# Altium footprint library connectors_socets.pcblib: 567 footprints (part 25 of 36)
Each footprint in its own frame and in the unit in brackets; x right, y up, seen from the top. Pads: shape width x height; smd on the part's side, far side on the other; paste and mask are expansions set on the pad; w line width, h text height; cw(c..) or ccw(c..) is an arc to the next point about the centre after c.
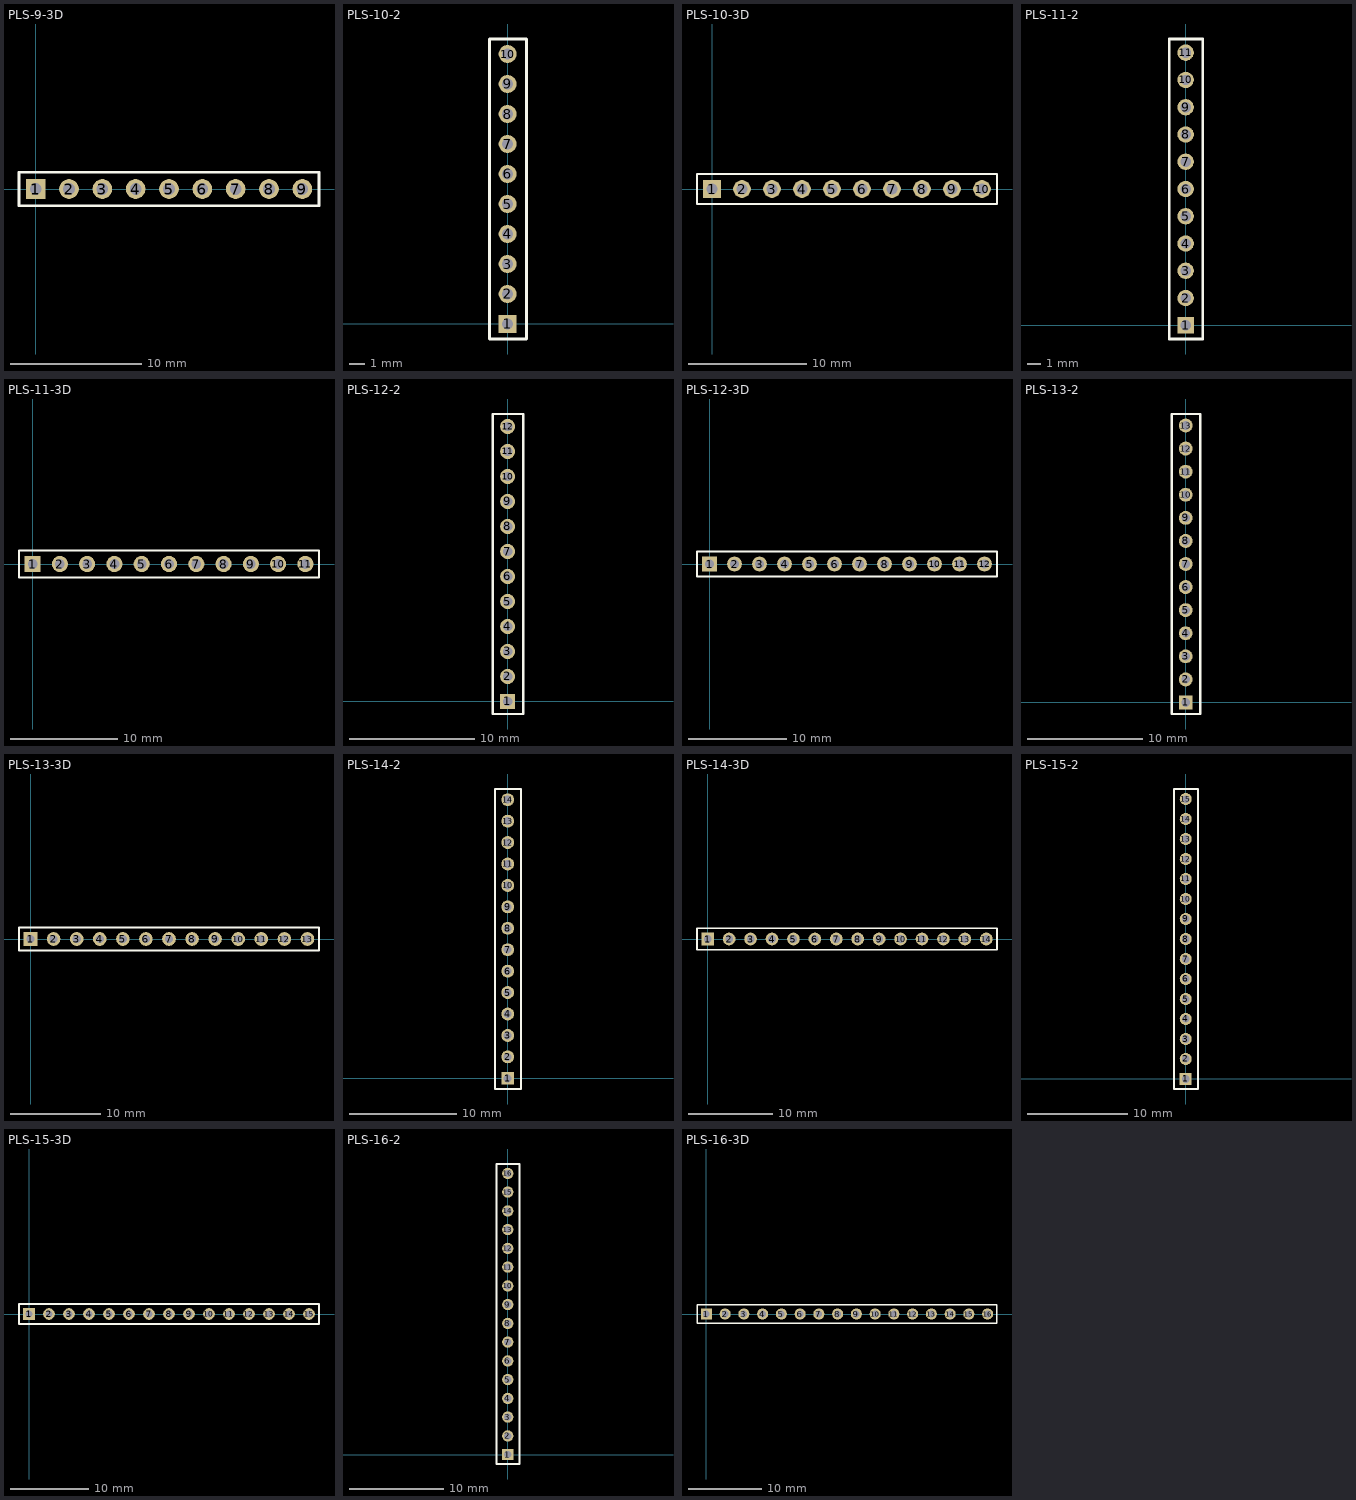
[diagram p24: the footprints below, top view; thin cyan lines are the x and y axes]

## PLS-9-3D [mm] "Connector; Header; 9 Position"
height 7.5
pads (9):
  rect 1.5x1.5 hole 0.9: 1(0,0)
  round 1.5 hole 0.9: 2(2.54,0) 3(5.08,0) 4(7.62,0) 5(10.16,0) 6(12.7,0) 7(15.24,0) 8(17.78,0) 9(20.32,0)
Top Overlay:
  lines w0.2: -1.27,-1.27 -1.27,1.27 21.59,1.27 21.59,-1.27 -1.27,-1.27
3D body "PLS-1.step": height 8.44, standoff -3, extent 19.05,-1.27 21.59,1.27
3D body "PLS-1.step": height 8.44, standoff -3, extent 16.51,-1.27 19.05,1.27
3D body "PLS-1.step": height 8.44, standoff -3, extent 13.97,-1.27 16.51,1.27
3D body "PLS-1.step": height 8.44, standoff -3, extent 11.43,-1.27 13.97,1.27
3D body "PLS-1.step": height 8.44, standoff -3, extent 8.89,-1.27 11.43,1.27
3D body "PLS-1.step": height 8.44, standoff -3, extent 6.35,-1.27 8.89,1.27
3D body "PLS-1.step": height 8.44, standoff -3, extent 3.81,-1.27 6.35,1.27
3D body "PLS-1.step": height 8.44, standoff -3, extent 1.27,-1.27 3.81,1.27
3D body "PLS-1.step": height 8.44, standoff -3, extent -1.27,-1.27 1.27,1.27

## PLS-10-2 [mm] "Connector; Header; 1x10 Position"
height 6
pads (10):
  rect 1.2x1.2 hole 0.75: 1(0,0)
  round 1.2 hole 0.75: 2(0,2) 3(0,4) 4(0,6) 5(0,8)
  round 1.2 hole 0.75 unplated: 6(0,10) 7(0,12) 8(0,14) 9(0,16) 10(0,18)
Top Overlay:
  lines w0.2: -1.2,-1 -1.2,19 1.25,19 1.25,-1 -1.2,-1
3D body "pls-2mm.stp": height 5.5, standoff -2.5, extent -1.2,17 1.2,19
3D body "pls-2mm.stp": height 5.5, standoff -2.5, extent -1.2,15 1.2,17
3D body "pls-2mm.stp": height 5.5, standoff -2.5, extent -1.2,13 1.2,15
3D body "pls-2mm.stp": height 5.5, standoff -2.5, extent -1.2,11 1.2,13
3D body "pls-2mm.stp": height 5.5, standoff -2.5, extent -1.2,9 1.2,11
3D body "pls-2mm.stp": height 5.5, standoff -2.5, extent -1.2,-1 1.2,1
3D body "pls-2mm.stp": height 5.5, standoff -2.5, extent -1.2,1 1.2,3
3D body "pls-2mm.stp": height 5.5, standoff -2.5, extent -1.2,3 1.2,5
3D body "pls-2mm.stp": height 5.5, standoff -2.5, extent -1.2,5 1.2,7
3D body "pls-2mm.stp": height 5.5, standoff -2.5, extent -1.2,7 1.2,9

## PLS-10-3D [mm] "Connector; Header; 10 Position"
height 7.5
pads (10):
  rect 1.5x1.5 hole 0.9: 1(0,0)
  round 1.5 hole 0.9: 2(2.54,0) 3(5.08,0) 4(7.62,0) 5(10.16,0) 6(12.7,0) 7(15.24,0) 8(17.78,0) 9(20.32,0) 10(22.86,0)
Top Overlay:
  lines w0.2: -1.27,-1.27 24.13,-1.27 24.13,1.27 -1.27,1.27 -1.27,-1.27
3D body "PLS-1.step": height 8.44, standoff -3, extent 21.59,-1.27 24.13,1.27
3D body "PLS-1.step": height 8.44, standoff -3, extent 19.05,-1.27 21.59,1.27
3D body "PLS-1.step": height 8.44, standoff -3, extent 16.51,-1.27 19.05,1.27
3D body "PLS-1.step": height 8.44, standoff -3, extent 13.97,-1.27 16.51,1.27
3D body "PLS-1.step": height 8.44, standoff -3, extent 11.43,-1.27 13.97,1.27
3D body "PLS-1.step": height 8.44, standoff -3, extent 8.89,-1.27 11.43,1.27
3D body "PLS-1.step": height 8.44, standoff -3, extent 6.35,-1.27 8.89,1.27
3D body "PLS-1.step": height 8.44, standoff -3, extent 3.81,-1.27 6.35,1.27
3D body "PLS-1.step": height 8.44, standoff -3, extent 1.27,-1.27 3.81,1.27
3D body "PLS-1.step": height 8.44, standoff -3, extent -1.27,-1.27 1.27,1.27

## PLS-11-2 [mm] "Connector; Header; 1x11 Position"
height 6
pads (11):
  rect 1.2x1.2 hole 0.75: 1(0,0)
  round 1.2 hole 0.75: 2(0,2) 3(0,4) 4(0,6) 5(0,8)
  round 1.2 hole 0.75 unplated: 6(0,10) 7(0,12) 8(0,14) 9(0,16) 10(0,18) 11(0,20)
Top Overlay:
  lines w0.2: -1.2,-1 -1.2,21 1.25,21 1.25,-1 -1.2,-1
3D body "pls-2mm.stp": height 5.5, standoff -2.5, extent -1.2,19 1.2,21
3D body "pls-2mm.stp": height 5.5, standoff -2.5, extent -1.2,17 1.2,19
3D body "pls-2mm.stp": height 5.5, standoff -2.5, extent -1.2,15 1.2,17
3D body "pls-2mm.stp": height 5.5, standoff -2.5, extent -1.2,13 1.2,15
3D body "pls-2mm.stp": height 5.5, standoff -2.5, extent -1.2,11 1.2,13
3D body "pls-2mm.stp": height 5.5, standoff -2.5, extent -1.2,9 1.2,11
3D body "pls-2mm.stp": height 5.5, standoff -2.5, extent -1.2,-1 1.2,1
3D body "pls-2mm.stp": height 5.5, standoff -2.5, extent -1.2,1 1.2,3
3D body "pls-2mm.stp": height 5.5, standoff -2.5, extent -1.2,3 1.2,5
3D body "pls-2mm.stp": height 5.5, standoff -2.5, extent -1.2,5 1.2,7
3D body "pls-2mm.stp": height 5.5, standoff -2.5, extent -1.2,7 1.2,9

## PLS-11-3D [mm] "Connector; Header; 11 Position"
height 7.5
pads (11):
  rect 1.5x1.5 hole 0.9: 1(0,0)
  round 1.5 hole 0.9: 2(2.54,0) 3(5.08,0) 4(7.62,0) 5(10.16,0) 6(12.7,0) 7(15.24,0) 8(17.78,0) 9(20.32,0) 10(22.86,0) 11(25.4,0)
Top Overlay:
  lines w0.2: -1.27,-1.27 26.67,-1.27 26.67,1.27 -1.27,1.27 -1.27,-1.27
3D body "PLS-1.step": height 8.44, standoff -3, extent -1.27,-1.27 1.27,1.27
3D body "PLS-1.step": height 8.44, standoff -3, extent 1.27,-1.27 3.81,1.27
3D body "PLS-1.step": height 8.44, standoff -3, extent 3.81,-1.27 6.35,1.27
3D body "PLS-1.step": height 8.44, standoff -3, extent 6.35,-1.27 8.89,1.27
3D body "PLS-1.step": height 8.44, standoff -3, extent 8.89,-1.27 11.43,1.27
3D body "PLS-1.step": height 8.44, standoff -3, extent 11.43,-1.27 13.97,1.27
3D body "PLS-1.step": height 8.44, standoff -3, extent 13.97,-1.27 16.51,1.27
3D body "PLS-1.step": height 8.44, standoff -3, extent 16.51,-1.27 19.05,1.27
3D body "PLS-1.step": height 8.44, standoff -3, extent 19.05,-1.27 21.59,1.27
3D body "PLS-1.step": height 8.44, standoff -3, extent 21.59,-1.27 24.13,1.27
3D body "PLS-1.step": height 8.44, standoff -3, extent 24.13,-1.27 26.67,1.27

## PLS-12-2 [mm] "Connector; Header; 1x12 Position"
height 6
pads (12):
  rect 1.2x1.2 hole 0.75: 1(0,0)
  round 1.2 hole 0.75: 2(0,2) 3(0,4) 4(0,6) 5(0,8)
  round 1.2 hole 0.75 unplated: 6(0,10) 7(0,12) 8(0,14) 9(0,16) 10(0,18) 11(0,20) 12(0,22)
Top Overlay:
  lines w0.2: -1.2,-1 -1.2,23 1.25,23 1.25,-1 -1.2,-1
3D body "pls-2mm.stp": height 5.5, standoff -2.5, extent -1.2,21 1.2,23
3D body "pls-2mm.stp": height 5.5, standoff -2.5, extent -1.2,19 1.2,21
3D body "pls-2mm.stp": height 5.5, standoff -2.5, extent -1.2,17 1.2,19
3D body "pls-2mm.stp": height 5.5, standoff -2.5, extent -1.2,15 1.2,17
3D body "pls-2mm.stp": height 5.5, standoff -2.5, extent -1.2,13 1.2,15
3D body "pls-2mm.stp": height 5.5, standoff -2.5, extent -1.2,11 1.2,13
3D body "pls-2mm.stp": height 5.5, standoff -2.5, extent -1.2,9 1.2,11
3D body "pls-2mm.stp": height 5.5, standoff -2.5, extent -1.2,-1 1.2,1
3D body "pls-2mm.stp": height 5.5, standoff -2.5, extent -1.2,1 1.2,3
3D body "pls-2mm.stp": height 5.5, standoff -2.5, extent -1.2,3 1.2,5
3D body "pls-2mm.stp": height 5.5, standoff -2.5, extent -1.2,5 1.2,7
3D body "pls-2mm.stp": height 5.5, standoff -2.5, extent -1.2,7 1.2,9

## PLS-12-2.54 [mm]

## PLS-12-3D [mm] "Connector; Header; 12 Position"
height 7.5
pads (12):
  rect 1.5x1.5 hole 0.9: 1(0,0)
  round 1.5 hole 0.9: 2(2.54,0) 3(5.08,0) 4(7.62,0) 5(10.16,0) 6(12.7,0) 7(15.24,0) 8(17.78,0) 9(20.32,0) 10(22.86,0) 11(25.4,0) 12(27.94,0)
Top Overlay:
  lines w0.2: -1.27,-1.27 -1.27,1.27 29.21,1.27 29.21,-1.27 -1.27,-1.27
3D body "PLS-1.step": height 8.44, standoff -3, extent 26.67,-1.27 29.21,1.27
3D body "PLS-1.step": height 8.44, standoff -3, extent 24.13,-1.27 26.67,1.27
3D body "PLS-1.step": height 8.44, standoff -3, extent 21.59,-1.27 24.13,1.27
3D body "PLS-1.step": height 8.44, standoff -3, extent 19.05,-1.27 21.59,1.27
3D body "PLS-1.step": height 8.44, standoff -3, extent 16.51,-1.27 19.05,1.27
3D body "PLS-1.step": height 8.44, standoff -3, extent 13.97,-1.27 16.51,1.27
3D body "PLS-1.step": height 8.44, standoff -3, extent 11.43,-1.27 13.97,1.27
3D body "PLS-1.step": height 8.44, standoff -3, extent 8.89,-1.27 11.43,1.27
3D body "PLS-1.step": height 8.44, standoff -3, extent 6.35,-1.27 8.89,1.27
3D body "PLS-1.step": height 8.44, standoff -3, extent 3.81,-1.27 6.35,1.27
3D body "PLS-1.step": height 8.44, standoff -3, extent 1.27,-1.27 3.81,1.27
3D body "PLS-1.step": height 8.44, standoff -3, extent -1.27,-1.27 1.27,1.27

## PLS-13-2 [mm] "Connector; Header; 1x13 Position"
height 6
pads (13):
  rect 1.2x1.2 hole 0.75: 1(0,0)
  round 1.2 hole 0.75: 2(0,2) 3(0,4) 4(0,6) 5(0,8)
  round 1.2 hole 0.75 unplated: 6(0,10) 7(0,12) 8(0,14) 9(0,16) 10(0,18) 11(0,20) 12(0,22) 13(0,24)
Top Overlay:
  lines w0.2: -1.2,-1 -1.2,25 1.25,25 1.25,-1 -1.2,-1
3D body "pls-2mm.stp": height 5.5, standoff -2.5, extent -1.2,23 1.2,25
3D body "pls-2mm.stp": height 5.5, standoff -2.5, extent -1.2,21 1.2,23
3D body "pls-2mm.stp": height 5.5, standoff -2.5, extent -1.2,19 1.2,21
3D body "pls-2mm.stp": height 5.5, standoff -2.5, extent -1.2,17 1.2,19
3D body "pls-2mm.stp": height 5.5, standoff -2.5, extent -1.2,15 1.2,17
3D body "pls-2mm.stp": height 5.5, standoff -2.5, extent -1.2,13 1.2,15
3D body "pls-2mm.stp": height 5.5, standoff -2.5, extent -1.2,11 1.2,13
3D body "pls-2mm.stp": height 5.5, standoff -2.5, extent -1.2,9 1.2,11
3D body "pls-2mm.stp": height 5.5, standoff -2.5, extent -1.2,-1 1.2,1
3D body "pls-2mm.stp": height 5.5, standoff -2.5, extent -1.2,1 1.2,3
3D body "pls-2mm.stp": height 5.5, standoff -2.5, extent -1.2,3 1.2,5
3D body "pls-2mm.stp": height 5.5, standoff -2.5, extent -1.2,5 1.2,7
3D body "pls-2mm.stp": height 5.5, standoff -2.5, extent -1.2,7 1.2,9

## PLS-13-3D [mm] "Connector; Header; 13 Position"
height 7.5
pads (13):
  rect 1.5x1.5 hole 0.9: 1(0,0)
  round 1.5 hole 0.9: 2(2.54,0) 3(5.08,0) 4(7.62,0) 5(10.16,0) 6(12.7,0) 7(15.24,0) 8(17.78,0) 9(20.32,0) 10(22.86,0) 11(25.4,0) 12(27.94,0) 13(30.48,0)
Top Overlay:
  lines w0.2: -1.27,-1.27 -1.27,1.27 31.75,1.27 31.75,-1.27 -1.27,-1.27
3D body "PLS-1.step": height 8.44, standoff -3, extent 3.81,-1.27 6.35,1.27
3D body "PLS-1.step": height 8.44, standoff -3, extent 6.35,-1.27 8.89,1.27
3D body "PLS-1.step": height 8.44, standoff -3, extent 8.89,-1.27 11.43,1.27
3D body "PLS-1.step": height 8.44, standoff -3, extent 11.43,-1.27 13.97,1.27
3D body "PLS-1.step": height 8.44, standoff -3, extent 13.97,-1.27 16.51,1.27
3D body "PLS-1.step": height 8.44, standoff -3, extent 16.51,-1.27 19.05,1.27
3D body "PLS-1.step": height 8.44, standoff -3, extent 19.05,-1.27 21.59,1.27
3D body "PLS-1.step": height 8.44, standoff -3, extent 21.59,-1.27 24.13,1.27
3D body "PLS-1.step": height 8.44, standoff -3, extent 24.13,-1.27 26.67,1.27
3D body "PLS-1.step": height 8.44, standoff -3, extent 26.67,-1.27 29.21,1.27
3D body "PLS-1.step": height 8.44, standoff -3, extent 29.21,-1.27 31.75,1.27
3D body "PLS-1.step": height 8.44, standoff -3, extent 1.27,-1.27 3.81,1.27
3D body "PLS-1.step": height 8.44, standoff -3, extent -1.27,-1.27 1.27,1.27

## PLS-14-2 [mm] "Connector; Header; 1x14 Position"
height 6
pads (14):
  rect 1.2x1.2 hole 0.75: 1(0,0)
  round 1.2 hole 0.75: 2(0,2) 3(0,4) 4(0,6) 5(0,8)
  round 1.2 hole 0.75 unplated: 6(0,10) 7(0,12) 8(0,14) 9(0,16) 10(0,18) 11(0,20) 12(0,22) 13(0,24) 14(0,26)
Top Overlay:
  lines w0.2: -1.2,-1 1.25,-1 1.25,27 -1.2,27 -1.2,-1
3D body "pls-2mm.stp": height 5.5, standoff -2.5, extent -1.2,7 1.2,9
3D body "pls-2mm.stp": height 5.5, standoff -2.5, extent -1.2,5 1.2,7
3D body "pls-2mm.stp": height 5.5, standoff -2.5, extent -1.2,3 1.2,5
3D body "pls-2mm.stp": height 5.5, standoff -2.5, extent -1.2,1 1.2,3
3D body "pls-2mm.stp": height 5.5, standoff -2.5, extent -1.2,-1 1.2,1
3D body "pls-2mm.stp": height 5.5, standoff -2.5, extent -1.2,9 1.2,11
3D body "pls-2mm.stp": height 5.5, standoff -2.5, extent -1.2,11 1.2,13
3D body "pls-2mm.stp": height 5.5, standoff -2.5, extent -1.2,13 1.2,15
3D body "pls-2mm.stp": height 5.5, standoff -2.5, extent -1.2,15 1.2,17
3D body "pls-2mm.stp": height 5.5, standoff -2.5, extent -1.2,17 1.2,19
3D body "pls-2mm.stp": height 5.5, standoff -2.5, extent -1.2,19 1.2,21
3D body "pls-2mm.stp": height 5.5, standoff -2.5, extent -1.2,21 1.2,23
3D body "pls-2mm.stp": height 5.5, standoff -2.5, extent -1.2,23 1.2,25
3D body "pls-2mm.stp": height 5.5, standoff -2.5, extent -1.2,25 1.2,27

## PLS-14-3D [mm] "Connector; Header; 14 Position"
height 7.5
pads (14):
  rect 1.5x1.5 hole 0.9: 1(0,0)
  round 1.5 hole 0.9: 2(2.54,0) 3(5.08,0) 4(7.62,0) 5(10.16,0) 6(12.7,0) 7(15.24,0) 8(17.78,0) 9(20.32,0) 10(22.86,0) 11(25.4,0) 12(27.94,0) 13(30.48,0) 14(33.02,0)
Top Overlay:
  lines w0.2: -1.27,-1.27 34.29,-1.27 34.29,1.27 -1.27,1.27 -1.27,-1.27
3D body "PLS-1.step": height 8.44, standoff -3, extent 31.75,-1.27 34.29,1.27
3D body "PLS-1.step": height 8.44, standoff -3, extent 29.21,-1.27 31.75,1.27
3D body "PLS-1.step": height 8.44, standoff -3, extent 26.67,-1.27 29.21,1.27
3D body "PLS-1.step": height 8.44, standoff -3, extent 24.13,-1.27 26.67,1.27
3D body "PLS-1.step": height 8.44, standoff -3, extent 21.59,-1.27 24.13,1.27
3D body "PLS-1.step": height 8.44, standoff -3, extent 19.05,-1.27 21.59,1.27
3D body "PLS-1.step": height 8.44, standoff -3, extent 16.51,-1.27 19.05,1.27
3D body "PLS-1.step": height 8.44, standoff -3, extent 13.97,-1.27 16.51,1.27
3D body "PLS-1.step": height 8.44, standoff -3, extent 11.43,-1.27 13.97,1.27
3D body "PLS-1.step": height 8.44, standoff -3, extent 8.89,-1.27 11.43,1.27
3D body "PLS-1.step": height 8.44, standoff -3, extent 6.35,-1.27 8.89,1.27
3D body "PLS-1.step": height 8.44, standoff -3, extent 3.81,-1.27 6.35,1.27
3D body "PLS-1.step": height 8.44, standoff -3, extent 1.27,-1.27 3.81,1.27
3D body "PLS-1.step": height 8.44, standoff -3, extent -1.27,-1.27 1.27,1.27

## PLS-15-2 [mm] "Connector; Header; 1x15 Position"
height 6
pads (15):
  rect 1.2x1.2 hole 0.75: 1(0,0)
  round 1.2 hole 0.75: 2(0,2) 3(0,4) 4(0,6) 5(0,8)
  round 1.2 hole 0.75 unplated: 6(0,10) 7(0,12) 8(0,14) 9(0,16) 10(0,18) 11(0,20) 12(0,22) 13(0,24) 14(0,26) 15(0,28)
Top Overlay:
  lines w0.2: -1.2,-1 -1.2,29 1.25,29 1.25,-1 -1.2,-1
3D body "pls-2mm.stp": height 5.5, standoff -2.5, extent -1.2,27 1.2,29
3D body "pls-2mm.stp": height 5.5, standoff -2.5, extent -1.2,25 1.2,27
3D body "pls-2mm.stp": height 5.5, standoff -2.5, extent -1.2,23 1.2,25
3D body "pls-2mm.stp": height 5.5, standoff -2.5, extent -1.2,21 1.2,23
3D body "pls-2mm.stp": height 5.5, standoff -2.5, extent -1.2,19 1.2,21
3D body "pls-2mm.stp": height 5.5, standoff -2.5, extent -1.2,17 1.2,19
3D body "pls-2mm.stp": height 5.5, standoff -2.5, extent -1.2,15 1.2,17
3D body "pls-2mm.stp": height 5.5, standoff -2.5, extent -1.2,13 1.2,15
3D body "pls-2mm.stp": height 5.5, standoff -2.5, extent -1.2,11 1.2,13
3D body "pls-2mm.stp": height 5.5, standoff -2.5, extent -1.2,9 1.2,11
3D body "pls-2mm.stp": height 5.5, standoff -2.5, extent -1.2,-1 1.2,1
3D body "pls-2mm.stp": height 5.5, standoff -2.5, extent -1.2,1 1.2,3
3D body "pls-2mm.stp": height 5.5, standoff -2.5, extent -1.2,3 1.2,5
3D body "pls-2mm.stp": height 5.5, standoff -2.5, extent -1.2,5 1.2,7
3D body "pls-2mm.stp": height 5.5, standoff -2.5, extent -1.2,7 1.2,9

## PLS-15-3D [mm] "Connector; Header; 15 Position"
height 7.5
pads (15):
  rect 1.5x1.5 hole 0.9: 1(0,0)
  round 1.5 hole 0.9: 2(2.54,0) 3(5.08,0) 4(7.62,0) 5(10.16,0) 6(12.7,0) 7(15.24,0) 8(17.78,0) 9(20.32,0) 10(22.86,0) 11(25.4,0) 12(27.94,0) 13(30.48,0) 14(33.02,0) 15(35.56,0)
Top Overlay:
  lines w0.2: -1.27,-1.27 36.83,-1.27 36.83,1.27 -1.27,1.27 -1.27,-1.27
3D body "PLS-1.step": height 8.44, standoff -3, extent 34.29,-1.27 36.83,1.27
3D body "PLS-1.step": height 8.44, standoff -3, extent 31.75,-1.27 34.29,1.27
3D body "PLS-1.step": height 8.44, standoff -3, extent 29.21,-1.27 31.75,1.27
3D body "PLS-1.step": height 8.44, standoff -3, extent 26.67,-1.27 29.21,1.27
3D body "PLS-1.step": height 8.44, standoff -3, extent 24.13,-1.27 26.67,1.27
3D body "PLS-1.step": height 8.44, standoff -3, extent 21.59,-1.27 24.13,1.27
3D body "PLS-1.step": height 8.44, standoff -3, extent 19.05,-1.27 21.59,1.27
3D body "PLS-1.step": height 8.44, standoff -3, extent 16.51,-1.27 19.05,1.27
3D body "PLS-1.step": height 8.44, standoff -3, extent 13.97,-1.27 16.51,1.27
3D body "PLS-1.step": height 8.44, standoff -3, extent 11.43,-1.27 13.97,1.27
3D body "PLS-1.step": height 8.44, standoff -3, extent 8.89,-1.27 11.43,1.27
3D body "PLS-1.step": height 8.44, standoff -3, extent 6.35,-1.27 8.89,1.27
3D body "PLS-1.step": height 8.44, standoff -3, extent 3.81,-1.27 6.35,1.27
3D body "PLS-1.step": height 8.44, standoff -3, extent 1.27,-1.27 3.81,1.27
3D body "PLS-1.step": height 8.44, standoff -3, extent -1.27,-1.27 1.27,1.27

## PLS-16-2 [mm] "Connector; Header; 1x16 Position"
height 6
pads (16):
  rect 1.2x1.2 hole 0.75: 1(0,0)
  round 1.2 hole 0.75: 2(0,2) 3(0,4) 4(0,6) 5(0,8)
  round 1.2 hole 0.75 unplated: 6(0,10) 7(0,12) 8(0,14) 9(0,16) 10(0,18) 11(0,20) 12(0,22) 13(0,24) 14(0,26) 15(0,28) 16(0,30)
Top Overlay:
  lines w0.2: -1.2,-1 1.25,-1 1.25,31 -1.2,31 -1.2,-1
3D body "pls-2mm.stp": height 5.5, standoff -2.5, extent -1.2,7 1.2,9
3D body "pls-2mm.stp": height 5.5, standoff -2.5, extent -1.2,5 1.2,7
3D body "pls-2mm.stp": height 5.5, standoff -2.5, extent -1.2,3 1.2,5
3D body "pls-2mm.stp": height 5.5, standoff -2.5, extent -1.2,1 1.2,3
3D body "pls-2mm.stp": height 5.5, standoff -2.5, extent -1.2,-1 1.2,1
3D body "pls-2mm.stp": height 5.5, standoff -2.5, extent -1.2,9 1.2,11
3D body "pls-2mm.stp": height 5.5, standoff -2.5, extent -1.2,11 1.2,13
3D body "pls-2mm.stp": height 5.5, standoff -2.5, extent -1.2,13 1.2,15
3D body "pls-2mm.stp": height 5.5, standoff -2.5, extent -1.2,15 1.2,17
3D body "pls-2mm.stp": height 5.5, standoff -2.5, extent -1.2,17 1.2,19
3D body "pls-2mm.stp": height 5.5, standoff -2.5, extent -1.2,19 1.2,21
3D body "pls-2mm.stp": height 5.5, standoff -2.5, extent -1.2,21 1.2,23
3D body "pls-2mm.stp": height 5.5, standoff -2.5, extent -1.2,23 1.2,25
3D body "pls-2mm.stp": height 5.5, standoff -2.5, extent -1.2,25 1.2,27
3D body "pls-2mm.stp": height 5.5, standoff -2.5, extent -1.2,27 1.2,29
3D body "pls-2mm.stp": height 5.5, standoff -2.5, extent -1.2,29 1.2,31

## PLS-16-3D [mm] "Connector; Header; 16 Position"
height 7.5
pads (16):
  rect 1.5x1.5 hole 0.9: 1(0,0)
  round 1.5 hole 0.9: 2(2.54,0) 3(5.08,0) 4(7.62,0) 5(10.16,0) 6(12.7,0) 7(15.24,0) 8(17.78,0) 9(20.32,0) 10(22.86,0) 11(25.4,0) 12(27.94,0) 13(30.48,0) 14(33.02,0) 15(35.56,0) 16(38.1,0)
Top Overlay:
  lines w0.2: -1.27,-1.27 39.37,-1.27 39.37,1.27 -1.27,1.27 -1.27,-1.27
3D body "PLS-1.step": height 8.44, standoff -3, extent 36.83,-1.27 39.37,1.27
3D body "PLS-1.step": height 8.44, standoff -3, extent 34.29,-1.27 36.83,1.27
3D body "PLS-1.step": height 8.44, standoff -3, extent 31.75,-1.27 34.29,1.27
3D body "PLS-1.step": height 8.44, standoff -3, extent 29.21,-1.27 31.75,1.27
3D body "PLS-1.step": height 8.44, standoff -3, extent 26.67,-1.27 29.21,1.27
3D body "PLS-1.step": height 8.44, standoff -3, extent 24.13,-1.27 26.67,1.27
3D body "PLS-1.step": height 8.44, standoff -3, extent 21.59,-1.27 24.13,1.27
3D body "PLS-1.step": height 8.44, standoff -3, extent 19.05,-1.27 21.59,1.27
3D body "PLS-1.step": height 8.44, standoff -3, extent 16.51,-1.27 19.05,1.27
3D body "PLS-1.step": height 8.44, standoff -3, extent 13.97,-1.27 16.51,1.27
3D body "PLS-1.step": height 8.44, standoff -3, extent 11.43,-1.27 13.97,1.27
3D body "PLS-1.step": height 8.44, standoff -3, extent 8.89,-1.27 11.43,1.27
3D body "PLS-1.step": height 8.44, standoff -3, extent 6.35,-1.27 8.89,1.27
3D body "PLS-1.step": height 8.44, standoff -3, extent 3.81,-1.27 6.35,1.27
3D body "PLS-1.step": height 8.44, standoff -3, extent 1.27,-1.27 3.81,1.27
3D body "PLS-1.step": height 8.44, standoff -3, extent -1.27,-1.27 1.27,1.27